# Altium footprint library 4wheel sensor board.PcbLib: 22 footprints (part 2 of 2)
Each footprint in its own frame and in the unit in brackets; x right, y up, seen from the top. Pads: shape width x height; smd on the part's side, far side on the other; paste and mask are expansions set on the pad; w line width, h text height; cw(c..) or ccw(c..) is an arc to the next point about the centre after c.
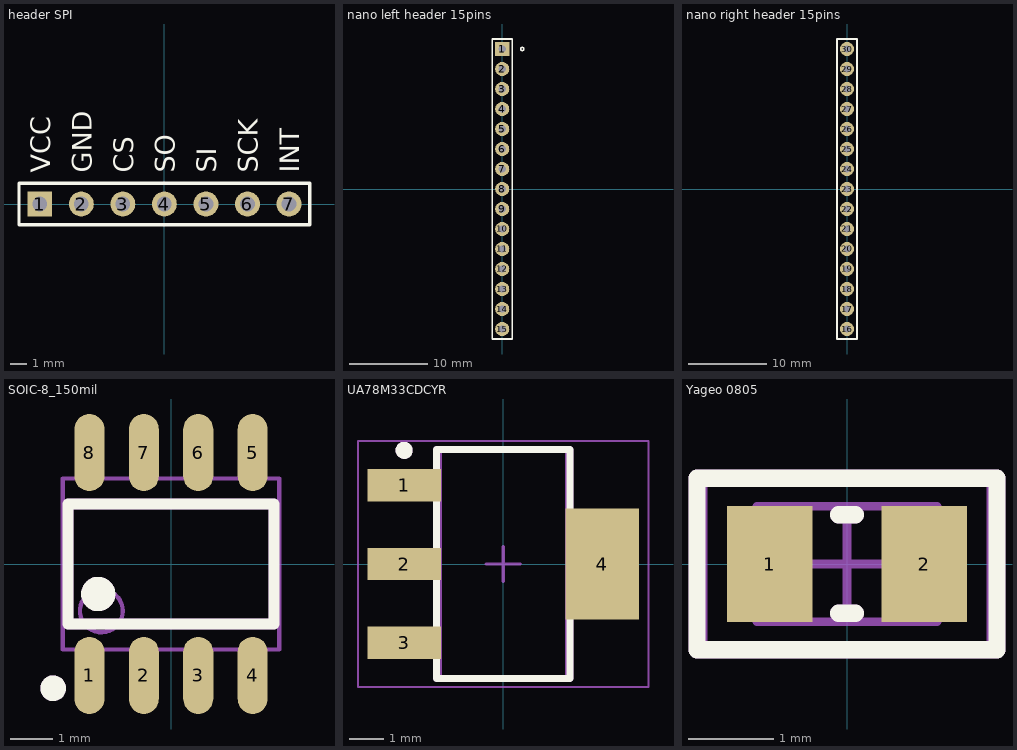
[diagram p1: the footprints below, top view; thin cyan lines are the x and y axes]

## header SPI [mil]
pads (7):
  rect 60x60 hole 35.43: 1(-300,0)
  round 60 hole 35.43: 2(-200,0) 3(-100,0) 4(0,0) 5(100,0) 6(200,0) 7(300,0)
Top Overlay:
  lines w7.87: -350,-50 -350,50 350,50 350,-50 -350,-50
  text "INT" at 325,75 h47.24
  text "SCK" at 225,75 h47.24
  text "SI" at 125,75 h47.24
  text "SO" at 25,75 h47.24
  text "CS" at -75,75 h47.24
  text "GND" at -175,75 h47.24
  text "VCC" at -275,75 h47.24
3D body "逼皐7pin.SLDPRT": height 335.15, standoff -294.77, extent -350.01,-50 349.99,50

## nano left header 15pins [mm]
pads (15):
  rect 1.8x1.8 hole 0.9: 1(0,17.78)
  round 1.8 hole 0.9: 2(0,15.24) 3(0,12.7) 4(0,10.16) 5(0,7.62) 6(0,5.08) 7(0,2.54) 8(0,0) 9(0,-2.54) 10(0,-5.08) 11(0,-7.62) 12(0,-10.16) 13(0,-12.7) 14(0,-15.24) 15(0,-17.78)
Top Overlay:
  circle w0.2: c2.54,17.78 r0.2
  lines w0.2: -1.27,-19.05 -1.27,19.05 1.27,19.05 1.27,-19.05 -1.27,-19.05
3D body "逼皐15pin.SLDPRT": height 8.51, standoff -7.49, extent -1.27,-19.05 1.27,19.05

## nano right header 15pins [mm]
pads (15):
  round 1.8 hole 0.9: 16(0,-17.78) 17(0,-15.24) 18(0,-12.7) 19(0,-10.16) 20(0,-7.62) 21(0,-5.08) 22(0,-2.54) 23(0,0) 24(0,2.54) 25(0,5.08) 26(0,7.62) 27(0,10.16) 28(0,12.7) 29(0,15.24) 30(0,17.78)
Top Overlay:
  lines w0.2: -1.27,-19.05 -1.27,19.05 1.27,19.05 1.27,-19.05 -1.27,-19.05
3D body "逼皐15pin.SLDPRT": height 8.51, standoff -7.49, extent -1.27,-19.05 1.27,19.05

## SOIC-8_150mil [mm]
pads (8):
  oval 0.7x1.8 smd: 1(-1.905,-2.6) 2(-0.635,-2.6) 3(0.635,-2.6) 4(1.905,-2.6) 5(1.905,2.6) 6(0.635,2.6) 7(-0.635,2.6) 8(-1.905,2.6)
Top Overlay:
  circle w0.3: c-2.75,-2.9 r0.15
  circle w0.4: c-1.7,-0.7 r0.2
  lines w0.254: -2.4,-1.4 2.4,-1.4 2.4,1.4 -2.4,1.4 -2.4,-1.4
Mechanical 13:
  circle w0.1: c-1.625,-1.095 r0.5
  lines w0.1: -2.525,-1.995 2.525,-1.995 2.525,1.995 -2.525,1.995 -2.525,-1.995
Mechanical 29:
  circle w0.4: c-1.7,-0.7 r0.2
  circle w0.3: c-2.75,-2.9 r0.15
  lines w0.254: -2.4,-1.4 -2.4,1.4 2.4,1.4 2.4,-1.4 -2.4,-1.4
Mechanical 30:
  text "'.Designator'" at 0,0 h1.54
3D body "THVD1429DT--3DModel-STEP-56544.STEP": height 1.64, standoff -0.11, extent -2.451,-2.997 2.451,2.997

## UA78M33CDCYR [mm] "SOT223, 4-Leads, Body 6.50x7.00mm (avg), Pitch 2.30mm, IPC Medium Density"
height 1.8
pads (4):
  rect 2.15x0.95 smd: 1(-2.9,2.3) 2(-2.9,0) 3(-2.9,-2.3)
  rect 2.15x3.25 smd: 4(2.9,0)
Top Overlay:
  circle w0.25: c-2.9,3.325 r0.125
  lines w0.2: -1.95,-3.35 1.95,-3.35 1.95,3.35 -1.95,3.35 -1.95,-3.35
Mechanical 1:
  text "'.Designator'" at 0,0 h0.7
Top Courtyard:
  lines w0.05: -4.25,-3.6 4.25,-3.6 4.25,3.6 -4.25,3.6 -4.25,-3.6
  lines w0.1: -0.5,0 0.5,0 ; 0,-0.5 0,0.5
Top Assembly:
  lines w0.1: -1.85,-3.35 1.85,-3.35 1.85,3.35 -1.85,3.35 -1.85,-3.35
Mechanical 29:
  circle w0.25: c-2.9,3.325 r0.125
  lines w0.2: -1.95,-3.35 1.95,-3.35 1.95,3.35 -1.95,3.35 -1.95,-3.35
Mechanical 30:
  text "'.Designator'" at 0,0 h1.54
3D body "UA78M33CDCYR .step": height 1.8, standoff 0, extent -3.5,-3.35 3.5,3.35

## Yageo 0805 [mm]
height 0.6
pads (2):
  rect 1x1.35 smd: 1(-0.9,0) 2(0.9,0)
Top Overlay:
  lines w0.2: -0.1,-0.575 0.1,-0.575 ; -0.1,0.575 0.1,0.575 ; -1.75,-1 1.75,-1 1.75,1 -1.75,1 -1.75,-1
Mechanical 1:
  text "'.Designator'" at 0,0 h0.7
Top Courtyard:
  lines w0.05: -1.65,-0.95 1.65,-0.95 1.65,0.95 -1.65,0.95 -1.65,-0.95
  lines w0.1: -0.5,0 0.5,0 ; 0,-0.5 0,0.5
Top Assembly:
  lines w0.1: -1.05,-0.675 1.05,-0.675 1.05,0.675 -1.05,0.675 -1.05,-0.675
Mechanical 29:
  lines w0.2: -0.1,-0.575 0.1,-0.575 ; -0.1,0.575 0.1,0.575 ; -1.75,-1 1.75,-1 1.75,1 -1.75,1 -1.75,-1
Mechanical 30:
  text "'.Designator'" at 0,0 h1.54
3D body: height 0.6, standoff 0, extent 0.7,-0.675 1.05,0.675
3D body: height 0.6, standoff 0, extent -1.05,-0.675 -0.7,0.675
3D body: height 0.6, standoff 0, extent -0.7,-0.675 0.7,0.675